# Altium footprint library hand_ad_lib.PcbLib: 105 footprints (part 7 of 7)
Each footprint in its own frame and in the unit in brackets; x right, y up, seen from the top. Pads: shape width x height; smd on the part's side, far side on the other; paste and mask are expansions set on the pad; w line width, h text height; cw(c..) or ccw(c..) is an arc to the next point about the centre after c.
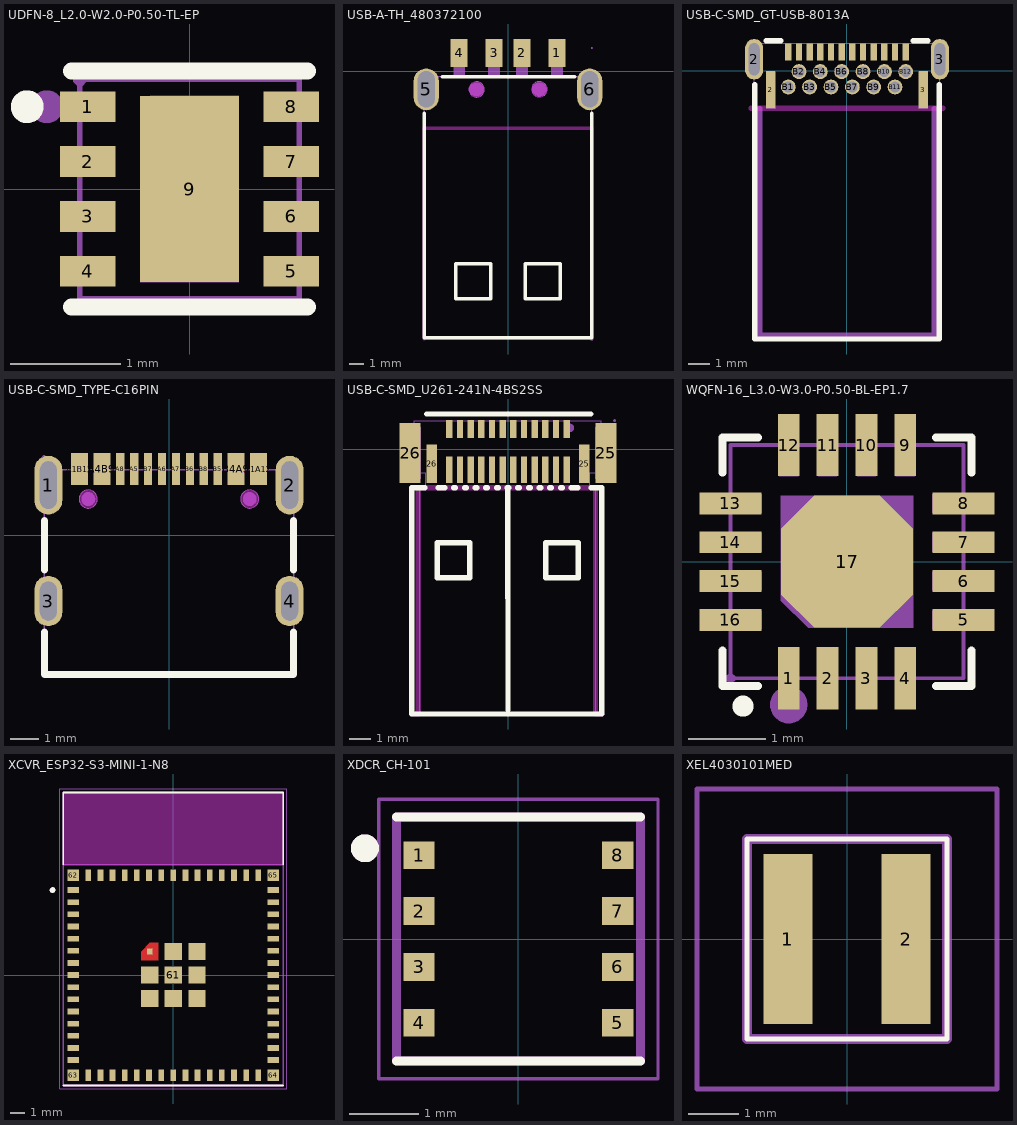
[diagram p6: the footprints below, top view; thin cyan lines are the x and y axes]

## UDFN-8_L2.0-W2.0-P0.50-TL-EP [mm]
pads (9):
  rect 0.505x0.28 smd: 1(-0.928,0.75) 2(-0.928,0.25) 3(-0.928,-0.25) 4(-0.928,-0.75) 5(0.928,-0.75) 6(0.928,-0.25) 7(0.928,0.25) 8(0.928,0.75)
  rect 0.9x1.7 smd: 9(0,0)
Top Overlay:
  circle w0.15: c-1.48,0.75 r0.075
  lines w0.152: -1.076,-1.076 1.076,-1.076 ; -1.076,1.076 1.076,1.076
Mechanical 6:
  circle w0.15: c-1.3,0.75 r0.075
Mechanical 15:
  region: -0.94,1 -0.941,1.024 -0.976,1.059 -1.024,1.059 -1.059,1.024 -1.06,1 -1.059,0.976 -1.024,0.941 -0.976,0.941 -0.941,0.976
  region: -1,0.875 -0.7,0.875 -0.7,0.625 -1,0.625
  region: -1,0.375 -0.7,0.375 -0.7,0.125 -1,0.125
  region: -1,-0.125 -0.7,-0.125 -0.7,-0.375 -1,-0.375
  region: -1,-0.625 -0.7,-0.625 -0.7,-0.875 -1,-0.875
  region: 1,-0.625 0.7,-0.625 0.7,-0.875 1,-0.875
  region: 1,-0.125 0.7,-0.125 0.7,-0.375 1,-0.375
  region: 1,0.375 0.7,0.375 0.7,0.125 1,0.125
  region: 1,0.875 0.7,0.875 0.7,0.625 1,0.625
  region: -0.36,0.85 0.45,0.85 0.45,-0.85 -0.45,-0.85 -0.45,0.76
  lines w0.051: -1,-1 1,-1 1,1 -1,1 -1,-1
3D body "TPS22965DSGR.x_t": height 0.81, standoff 0, extent -1,-0.99 1,0.99

## USB-A-TH_480372100 [mm]
pads (6):
  rect 1.2x2 smd paste-100 mask+0.051: 1(3.5,1.3) 2(1,1.3) 3(-1,1.3) 4(-3.5,1.3)
  oval 1.8x3 hole 1.2 slot 2.6 at 90 deg: 5(-5.85,-1.3) 6(5.85,-1.3)
Top Overlay:
  lines w0.254: -6,-3.021 -6,-19.09 ; -4.7,-0.39 4.762,-0.39 ; 6,-3.021 6,-19.09 -6,-19.09 ; -6,-19.09 -6,-19.09 ; -3.75,-16.29 -3.75,-13.79 -1.25,-13.79 -1.25,-16.29 -3.75,-16.29 ; 1.25,-16.29 1.25,-13.79 3.75,-13.79 3.75,-16.29 1.25,-16.29
Top Paste:
  region: 6.75,-1.9 6.75,-2.018 6.689,-2.247 6.57,-2.452 6.403,-2.62 6.197,-2.739 5.968,-2.8 5.731,-2.8 5.503,-2.739 5.297,-2.62 5.13,-2.452 5.011,-2.247 4.95,-2.018 4.95,-1.9 4.95,-0.7 4.95,-0.581 5.011,-0.352 5.13,-0.147 5.297,0.02 5.503,0.139 5.731,0.2 5.968,0.2 6.197,0.139 6.403,0.02 6.57,-0.147 6.689,-0.352 6.75,-0.581 6.75,-0.7
  region: -4.95,-1.9 -4.95,-2.018 -5.011,-2.247 -5.13,-2.452 -5.297,-2.62 -5.502,-2.739 -5.731,-2.8 -5.968,-2.8 -6.197,-2.739 -6.402,-2.62 -6.57,-2.452 -6.689,-2.247 -6.75,-2.018 -6.75,-1.9 -6.75,-0.7 -6.75,-0.581 -6.689,-0.352 -6.57,-0.147 -6.402,0.02 -6.197,0.139 -5.968,0.2 -5.731,0.2 -5.502,0.139 -5.297,0.02 -5.13,-0.147 -5.011,-0.352 -4.95,-0.581 -4.95,-0.7
  region: -4.101,2.299 -2.9,2.299 -2.9,0.3 -4.101,0.3
  region: 2.9,2.299 4.101,2.299 4.101,0.3 2.9,0.3
  region: 0.4,2.299 1.599,2.299 1.599,0.3 0.4,0.3
  region: -1.599,2.299 -0.4,2.299 -0.4,0.3 -1.599,0.3
Keep-Out Layer:
  board cut-out: 2.8,-1.3 2.799,-1.191 2.714,-0.991 2.559,-0.839 2.359,-0.756 2.141,-0.756 1.941,-0.839 1.786,-0.991 1.701,-1.191 1.7,-1.3 1.701,-1.408 1.786,-1.608 1.941,-1.761 2.141,-1.843 2.359,-1.843 2.559,-1.761 2.714,-1.608 2.799,-1.408
  board cut-out: -1.7,-1.313 -1.701,-1.204 -1.786,-1.004 -1.94,-0.851 -2.141,-0.769 -2.358,-0.769 -2.559,-0.851 -2.714,-1.004 -2.799,-1.204 -2.8,-1.312 -2.799,-1.421 -2.714,-1.621 -2.559,-1.774 -2.358,-1.856 -2.141,-1.856 -1.941,-1.774 -1.786,-1.621 -1.701,-1.421
Keep-Out Layer:
  lines w0.254: -6,-4.094 6,-4.094 ; -6,-4.094 -6,-19.16 -6,-4.094 ; -6,-4.094 6,-4.094 ; 6,-4.094 6,-19.17 6,-4.094
Mechanical 1:
  circle w0.005: c2.25,-1.3 r0.55
  circle w0.005: c-2.25,-1.313 r0.55
Mechanical 6:
  circle w0.5: c-2.25,-1.313 r0.25
  circle w0.5: c2.25,-1.3 r0.25
Mechanical 15:
  region: 3.101,-0.37 3.101,0.57 3.901,0.56 3.901,-0.37
  region: 3.101,0.56 3.101,1.64 3.901,1.64 3.901,0.55
  region: 0.6,-0.37 0.6,0.57 1.4,0.56 1.4,-0.37
  region: 0.6,0.56 0.6,1.64 1.4,1.64 1.4,0.55
  region: -1.4,-0.37 -1.4,0.57 -0.6,0.56 -0.6,-0.37
  region: -1.4,0.56 -1.4,1.64 -0.6,1.64 -0.6,0.55
  region: 6,-2.354 5.7,-2.354 5.7,-0.354 6,-0.354
  region: -5.7,-2.354 -6,-2.354 -6,-0.354 -5.7,-0.354
  region: -3.9,0.56 -3.9,1.64 -3.1,1.64 -3.1,0.55
  region: -3.9,-0.37 -3.9,0.57 -3.1,0.56 -3.1,-0.37
  region: 6.06,1.646 6.06,1.671 6.025,1.706 5.975,1.706 5.94,1.671 5.94,1.646 5.94,1.622 5.975,1.586 6.025,1.586 6.06,1.621
  lines w0.051: -6,-19.154 6,-19.154 6,-0.354 -6,-0.354 -6,-19.154
3D body "480372100.x_t": height 2, standoff -2.5, extent -6.339,-19.165 6.339,1.585

## USB-C-SMD_GT-USB-8013A [mm]
pads (28):
  oval 0.85x1.9 hole 0.5 slot 1.5 at 90 deg paste+0 mask+0.05: 2(-4.35,0.535) 3(4.35,0.535)
  rect 0.45x1.76 smd paste-100 mask+0.05: 2(-3.575,-0.885) 3(3.575,-0.885)
  rect 0.3x0.8 smd paste-100 mask+0.05: A1(2.75,0.885) A2(2.25,0.885) A3(1.75,0.885) A4(1.25,0.885) A5(0.75,0.885) A6(0.25,0.885) A7(-0.25,0.885) A8(-0.75,0.885) A9(-1.25,0.885) A10(-1.75,0.885) A11(-2.25,0.885) A12(-2.75,0.885)
  round 0.7 hole 0.5 paste-100 mask+0.05: B1(-2.75,-0.765) B2(-2.25,-0.045) B3(-1.75,-0.765) B4(-1.25,-0.045) B5(-0.75,-0.765) B6(-0.25,-0.045) B7(0.25,-0.765) B8(0.75,-0.045) B9(1.25,-0.765) B10(1.75,-0.045) B11(2.25,-0.765) B12(2.75,-0.045)
Top Overlay:
  lines w0.254: -4.318,-0.645 -4.318,-12.573 4.318,-12.573 4.318,-0.645 ; -3.787,1.397 -3.102,1.397 ; 3.102,1.397 3.787,1.397
Top Paste:
  drawing of 26 lines, arcs and shapes, not listed
Keep-Out Layer:
  lines w0.254: -4.5,-1.765 4.5,-1.765 -4.5,-1.765
Mechanical 6:
  region: -3.973,-1.8 -3.973,-12.273 3.973,-12.273 3.973,-1.8 3.973,-1.747 4.047,-1.673 4.153,-1.673 4.227,-1.747 4.227,-1.8 4.227,-12.4 4.227,-12.425 4.208,-12.472 4.172,-12.508 4.125,-12.527 4.1,-12.527 -4.1,-12.527 -4.125,-12.527 -4.172,-12.508 -4.208,-12.472 -4.227,-12.425 -4.227,-12.4 -4.227,-1.8 -4.227,-1.747 -4.153,-1.673 -4.047,-1.673 -3.973,-1.747
Mechanical 15:
  drawing of 33 lines, arcs and shapes, not listed
3D body "GT-USB-8013A.x_t": height 1.45, standoff -1.6, extent -4.377,-12.493 4.323,1.257

## USB-C-SMD_TYPE-C16PIN [mm]
pads (16):
  oval 1x2.1 hole 0.6 slot 1.7 at 90 deg: 1(-4.32,1.787) 2(4.32,1.787)
  oval 1x1.8 hole 0.6 slot 1.4 at 90 deg: 3(-4.32,-2.362) 4(4.32,-2.362)
  rect 0.6x1.15 smd paste-100 mask+0.051: A1B12(-3.2,2.362) A4B9(-2.4,2.362) B1A12(3.2,2.362) B4A9(2.4,2.362)
  rect 0.3x1.15 smd paste-100 mask+0.051: A5(-1.25,2.362) A6(-0.25,2.362) A7(0.25,2.362) A8(-1.75,2.362) B5(1.75,2.362) B6(0.75,2.362) B7(-0.75,2.362) B8(1.25,2.362)
Top Overlay:
  lines w0.254: -4.45,-3.482 -4.45,-5 4.45,-5 4.45,-3.482 ; -4.45,-1.243 -4.45,0.518 ; 4.45,-1.243 4.45,0.518
Top Paste:
  region: -3.5,2.937 -2.9,2.937 -2.9,1.787 -3.5,1.787
  region: -2.7,2.937 -2.1,2.937 -2.1,1.787 -2.7,1.787
  region: 2.9,2.937 3.5,2.937 3.5,1.787 2.9,1.787
  region: 2.1,2.937 2.7,2.937 2.7,1.787 2.1,1.787
  region: 1.6,2.937 1.9,2.937 1.9,1.787 1.6,1.787
  region: 1.1,2.937 1.4,2.937 1.4,1.787 1.1,1.787
  region: 0.6,2.937 0.9,2.937 0.9,1.787 0.6,1.787
  region: 0.1,2.937 0.4,2.937 0.4,1.787 0.1,1.787
  region: -0.4,2.937 -0.1,2.937 -0.1,1.787 -0.4,1.787
  region: -0.9,2.937 -0.6,2.937 -0.6,1.787 -0.9,1.787
  region: -1.4,2.937 -1.1,2.937 -1.1,1.787 -1.4,1.787
  region: -1.9,2.937 -1.6,2.937 -1.6,1.787 -1.9,1.787
  region: 3.82,-1.962 3.82,-1.863 3.896,-1.679 4.037,-1.539 4.221,-1.462 4.419,-1.462 4.603,-1.539 4.744,-1.679 4.82,-1.863 4.82,-1.962 4.82,-2.762 4.82,-2.862 4.744,-3.046 4.603,-3.186 4.419,-3.262 4.221,-3.262 4.037,-3.186 3.896,-3.046 3.82,-2.862 3.82,-2.762
  region: -4.82,-1.962 -4.82,-1.863 -4.744,-1.679 -4.603,-1.539 -4.419,-1.462 -4.221,-1.462 -4.037,-1.539 -3.896,-1.679 -3.82,-1.863 -3.82,-1.962 -3.82,-2.762 -3.82,-2.862 -3.896,-3.046 -4.037,-3.186 -4.221,-3.262 -4.419,-3.262 -4.603,-3.186 -4.744,-3.046 -4.82,-2.862 -4.82,-2.762
  region: 3.82,2.337 3.82,2.437 3.896,2.621 4.037,2.761 4.221,2.837 4.419,2.837 4.603,2.761 4.744,2.621 4.82,2.437 4.82,2.337 4.82,1.237 4.82,1.138 4.744,0.954 4.603,0.814 4.419,0.737 4.221,0.737 4.037,0.814 3.896,0.954 3.82,1.138 3.82,1.237
  region: -4.82,2.337 -4.82,2.437 -4.744,2.621 -4.603,2.761 -4.419,2.837 -4.221,2.837 -4.037,2.761 -3.896,2.621 -3.82,2.437 -3.82,2.337 -3.82,1.237 -3.82,1.138 -3.896,0.954 -4.037,0.814 -4.221,0.737 -4.419,0.737 -4.603,0.814 -4.744,0.954 -4.82,1.138 -4.82,1.237
Keep-Out Layer:
  board cut-out: 3.215,1.288 3.215,1.353 3.166,1.472 3.074,1.564 2.955,1.613 2.825,1.613 2.706,1.564 2.614,1.472 2.565,1.353 2.565,1.288 2.565,1.223 2.615,1.104 2.706,1.012 2.825,0.963 2.955,0.963 3.074,1.013 3.166,1.104 3.215,1.223
  board cut-out: -2.565,1.288 -2.565,1.353 -2.615,1.472 -2.706,1.564 -2.825,1.613 -2.955,1.613 -3.074,1.564 -3.166,1.472 -3.215,1.353 -3.215,1.288 -3.215,1.223 -3.166,1.104 -3.074,1.012 -2.955,0.963 -2.825,0.963 -2.706,1.013 -2.614,1.104 -2.565,1.223
Mechanical 1:
  circle w0.005: c2.89,1.288 r0.325
  circle w0.005: c-2.89,1.288 r0.325
Mechanical 6:
  circle w0.25: c-2.89,1.288 r0.125
  circle w0.25: c2.89,1.288 r0.125
Mechanical 15:
  region: -4.41,2.803 -4.411,2.827 -4.446,2.86 -4.494,2.86 -4.529,2.827 -4.53,2.803 -4.529,2.778 -4.494,2.745 -4.446,2.745 -4.411,2.778
  region: -3.4,2.802 -3,2.802 -3,2.102 -3.4,2.102
  region: -2.6,2.802 -2.2,2.802 -2.2,2.102 -2.6,2.102
  region: 2.2,2.802 2.6,2.802 2.6,2.102 2.2,2.102
  region: 3,2.802 3.4,2.802 3.4,2.102 3,2.102
  region: -1.35,2.802 -1.15,2.802 -1.15,2.102 -1.35,2.102
  region: -0.85,2.802 -0.65,2.802 -0.65,2.102 -0.85,2.102
  region: -0.35,2.802 -0.15,2.802 -0.15,2.102 -0.35,2.102
  region: 0.15,2.802 0.35,2.802 0.35,2.102 0.15,2.102
  region: 0.65,2.802 0.85,2.802 0.85,2.102 0.65,2.102
  region: 1.15,2.802 1.35,2.802 1.35,2.102 1.15,2.102
  region: 1.65,2.802 1.85,2.802 1.85,2.102 1.65,2.102
  region: -4.47,2.337 -4.17,2.337 -4.17,1.237 -4.47,1.237
  region: 4.17,2.337 4.47,2.337 4.47,1.237 4.17,1.237
  region: 4.17,-1.962 4.47,-1.962 4.47,-2.762 4.17,-2.762
  region: -4.47,-1.962 -4.17,-1.962 -4.17,-2.762 -4.47,-2.762
  region: -1.85,2.803 -1.65,2.803 -1.65,2.103 -1.85,2.103
  lines w0.051: -4.47,-5.012 -4.47,2.338 4.47,2.338 4.47,-5.012 -4.47,-5.012
Multi-Layer keep-out:
  region: 3.215,1.288 3.215,1.353 3.166,1.472 3.074,1.564 2.955,1.613 2.825,1.613 2.706,1.564 2.614,1.472 2.565,1.353 2.565,1.288 2.565,1.223 2.615,1.104 2.706,1.012 2.825,0.963 2.955,0.963 3.074,1.013 3.166,1.104 3.215,1.223
  region: -2.565,1.288 -2.565,1.353 -2.615,1.472 -2.706,1.564 -2.825,1.613 -2.955,1.613 -3.074,1.564 -3.166,1.472 -3.215,1.353 -3.215,1.288 -3.215,1.223 -3.166,1.104 -3.074,1.012 -2.955,0.963 -2.825,0.963 -2.706,1.013 -2.614,1.104 -2.565,1.223
3D body "TYPE-C16PIN.x_t": height 3.26, standoff -0.84, extent -4.473,-5.079 4.467,2.821

## USB-C-SMD_U261-241N-4BS2SS [mm]
pads (28):
  rect 0.5x1.8 smd paste+0 mask+0.05: 25(3.575,-0.68) 26(-3.575,-0.68)
  rect 1x2.8 smd paste+0 mask+0.05: 25(4.59,-0.18) 26(-4.59,-0.18)
  rect 0.3x0.85 smd paste+0 mask+0.05: A1(2.75,0.955) A2(2.25,0.955) A3(1.75,0.955) A4(1.25,0.955) A5(0.75,0.955) A6(0.25,0.955) A7(-0.25,0.955) A8(-0.75,0.955) A9(-1.25,0.955) A10(-1.75,0.955) A11(-2.25,0.955) A12(-2.75,0.955)
  rect 0.3x1.25 smd paste+0 mask+0.05: B1(-2.75,-0.955) B2(-2.25,-0.955) B3(-1.75,-0.955) B4(-1.25,-0.955) B5(-0.75,-0.955) B6(-0.25,-0.955) B7(0.25,-0.955) B8(0.75,-0.955) B9(1.25,-0.955) B10(1.75,-0.955) B11(2.25,-0.955) B12(2.75,-0.955)
Top Overlay:
  lines w0.254: -3.889,-1.8 -4.2,-1.8 -4.5,-1.8 -4.5,-12.4 -4.4,-12.4 -4.1,-12.4 4.1,-12.4 4.4,-12.4 4.4,-1.8 4.3,-1.8 4.2,-1.8 3.889,-1.8 ; -3.81,1.651 3.888,1.651 ; -3.26,-1.8 -2.964,-1.8 ; -2.535,-1.8 -2.464,-1.8 ; -2.035,-1.8 -1.964,-1.8 ; -1.535,-1.8 -1.464,-1.8 ; -1.035,-1.8 -0.964,-1.8 ; -0.535,-1.8 -0.464,-1.8 ; -0.035,-1.8 0.036,-1.8 ; -0.009,-1.834 0,-12.192 ; 0.465,-1.8 0.536,-1.8 ; 0.965,-1.8 1.036,-1.8 ; 1.465,-1.8 1.536,-1.8 ; 1.965,-1.8 2.036,-1.8 ; 2.465,-1.8 2.536,-1.8 ; 2.965,-1.8 3.261,-1.8 ; -3.307,-6.025 -1.783,-6.025 -1.783,-4.374 -3.307,-4.374 -3.307,-6.025 ; 1.773,-6.025 3.297,-6.025 3.297,-4.374 1.773,-4.374 1.773,-6.025
Keep-Out Layer:
  lines w0.254: -4.2,-12.4 -4.2,-1.8 ; -4.2,-12.4 -4.5,-12.4 -4.2,-12.4 ; -4.2,-12.4 -4.2,-1.8 ; -4.2,-1.8 4.1,-1.8 ; -4.2,-1.8 4.1,-1.8 ; 4.1,-12.4 4.4,-12.4 4.1,-12.4 ; 4.1,-12.4 4.1,-1.8 ; 4.1,-12.4 4.1,-1.8
Mechanical 6:
  circle w0.2: c2.9,1 r0.1
Mechanical 15:
  drawing of 41 lines, arcs and shapes, not listed
3D body "U261-241N-4BS2SS.x_t": height 1.45, standoff -0.95, extent -4.99,-12.172 4.99,1.278

## WQFN-16_L3.0-W3.0-P0.50-BL-EP1.7 [mm]
pads (17):
  rect 0.28x0.8 smd paste-100 mask+0.051: 1(-0.75,-1.5) 2(-0.25,-1.5) 3(0.25,-1.5) 4(0.75,-1.5) 9(0.75,1.5) 10(0.25,1.5) 11(-0.25,1.5) 12(-0.75,1.5)
  rect 0.8x0.28 smd paste-100 mask+0.051: 5(1.5,-0.75) 6(1.5,-0.25) 7(1.5,0.25) 8(1.5,0.75) 13(-1.5,0.75) 14(-1.5,0.25) 15(-1.5,-0.25) 16(-1.5,-0.75)
  oct 1.7x1.7 smd paste-100 mask+0.051: 17(0,0)
Top Overlay:
  lines w0.102: -1.6,-1.144 -1.6,-1.6 -1.144,-1.6 ; -1.6,1.144 -1.6,1.6 -1.144,1.6 ; 1.144,-1.6 1.6,-1.6 1.6,-1.144 ; 1.144,1.6 1.6,1.6 1.6,1.144
  lines w0.25: -1.34,-1.85 ccw(c-1.339,-1.86) -1.337,-1.85
Top Paste:
  region: -0.89,-1.1 -0.61,-1.1 -0.61,-1.9 -0.89,-1.9
  region: -0.39,-1.1 -0.11,-1.1 -0.11,-1.9 -0.39,-1.9
  region: 0.11,-1.1 0.39,-1.1 0.39,-1.9 0.11,-1.9
  region: 0.61,-1.1 0.89,-1.1 0.89,-1.9 0.61,-1.9
  region: 1.1,-0.61 1.9,-0.61 1.9,-0.89 1.1,-0.89
  region: 1.1,-0.11 1.9,-0.11 1.9,-0.39 1.1,-0.39
  region: 1.1,0.39 1.9,0.39 1.9,0.11 1.1,0.11
  region: 1.1,0.89 1.9,0.89 1.9,0.61 1.1,0.61
  region: 0.61,1.9 0.89,1.9 0.89,1.1 0.61,1.1
  region: 0.11,1.9 0.39,1.9 0.39,1.1 0.11,1.1
  region: -0.39,1.9 -0.11,1.9 -0.11,1.1 -0.39,1.1
  region: -0.89,1.9 -0.61,1.9 -0.61,1.1 -0.89,1.1
  region: -1.9,0.89 -1.1,0.89 -1.1,0.61 -1.9,0.61
  region: -1.9,0.39 -1.1,0.39 -1.1,0.11 -1.9,0.11
  region: -1.9,-0.11 -1.1,-0.11 -1.1,-0.39 -1.9,-0.39
  region: -1.9,-0.61 -1.1,-0.61 -1.1,-0.89 -1.9,-0.89
  region: -0.68,0.68 0.68,0.68 0.68,-0.68 -0.4,-0.68 -0.68,-0.4
Mechanical 6:
  circle w0.24: c-0.75,-1.84 r0.12
Mechanical 15:
  region: -1.5,-0.87 -1.5,-0.63 -1.1,-0.63 -1.1,-0.87
  region: -1.5,-0.37 -1.5,-0.13 -1.1,-0.13 -1.1,-0.37
  region: -1.5,0.13 -1.5,0.37 -1.1,0.37 -1.1,0.13
  region: -1.5,0.63 -1.5,0.87 -1.1,0.87 -1.1,0.63
  region: -0.87,1.1 -0.87,1.5 -0.63,1.5 -0.63,1.1
  region: -0.37,1.1 -0.37,1.5 -0.13,1.5 -0.13,1.1
  region: 0.13,1.1 0.13,1.5 0.37,1.5 0.37,1.1
  region: 0.63,1.1 0.63,1.5 0.87,1.5 0.87,1.1
  region: 1.1,0.63 1.1,0.87 1.5,0.87 1.5,0.63
  region: 1.1,0.13 1.1,0.37 1.5,0.37 1.5,0.13
  region: 1.1,-0.37 1.1,-0.13 1.5,-0.13 1.5,-0.37
  region: 1.1,-0.87 1.1,-0.63 1.5,-0.63 1.5,-0.87
  region: 0.63,-1.5 0.63,-1.1 0.87,-1.1 0.87,-1.5
  region: 0.13,-1.5 0.13,-1.1 0.37,-1.1 0.37,-1.5
  region: -0.37,-1.5 -0.37,-1.1 -0.13,-1.1 -0.13,-1.5
  region: -0.87,-1.5 -0.87,-1.1 -0.63,-1.1 -0.63,-1.5
  region: -0.85,0.85 0.85,0.85 0.85,-0.85 -0.5,-0.85 -0.85,-0.5
  region: -1.44,-1.5 -1.441,-1.476 -1.476,-1.442 -1.524,-1.442 -1.559,-1.476 -1.56,-1.5 -1.559,-1.524 -1.524,-1.558 -1.476,-1.558 -1.441,-1.524
  lines w0.051: -1.5,-1.5 -1.5,1.5 1.5,1.5 1.5,-1.5 -1.5,-1.5
3D body "BQ25302RTER.x_t": height 0.78, standoff 0, extent -1.501,-1.501 1.501,1.501

## XCVR_ESP32-S3-MINI-1-N8 [mm]
height 2.55
pads (73):
  rect 0.8x0.4 smd: 1(-7,5.95) 2(-7,5.1) 3(-7,4.25) 4(-7,3.4) 5(-7,2.55) 6(-7,1.7) 7(-7,0.85) 8(-7,0) 9(-7,-0.85) 10(-7,-1.7) 11(-7,-2.55) 12(-7,-3.4) 13(-7,-4.25) 14(-7,-5.1) 15(-7,-5.95) 31(7,-5.95) 32(7,-5.1) 33(7,-4.25) 34(7,-3.4) 35(7,-2.55) 36(7,-1.7) 37(7,-0.85) 38(7,0) 39(7,0.85) 40(7,1.7) 41(7,2.55) 42(7,3.4) 43(7,4.25) 44(7,5.1) 45(7,5.95)
  rect 0.4x0.8 smd: 16(-5.95,-7) 17(-5.1,-7) 18(-4.25,-7) 19(-3.4,-7) 20(-2.55,-7) 21(-1.7,-7) 22(-0.85,-7) 23(0,-7) 24(0.85,-7) 25(1.7,-7) 26(2.55,-7) 27(3.4,-7) 28(4.25,-7) 29(5.1,-7) 30(5.95,-7) 46(5.95,7) 47(5.1,7) 48(4.25,7) 49(3.4,7) 50(2.55,7) 51(1.7,7) 52(0.85,7) 53(0,7) 54(-0.85,7) 55(-1.7,7) 56(-2.55,7) 57(-3.4,7) 58(-4.25,7) 59(-5.1,7) 60(-5.95,7)
  rect 1.2x1.2 smd: 61(0,0) 61_2(0,1.65) 61_3(1.65,1.65) 61_4(1.65,0) 61_5(1.65,-1.65) 61_6(0,-1.65) 61_7(-1.65,-1.65) 61_8(-1.65,0)
  rect 0.4x0.4 smd paste-1 mask+0: 61_1(-1.65,1.65)
  rect 0.8x0.8 smd: 62(-7,7) 63(-7,-7) 64(7,-7) 65(7,7)
Top Layer:
  region: -1.05,1.05 -2.25,1.05 -2.25,1.65 -1.65,2.25 -1.05,2.25
Top Overlay:
  circle w0.2: c-8.45,5.95 r0.1
  lines w0.127: -7.7,-7.725 7.7,-7.725 ; -7.7,7.725 -7.7,12.775 7.7,12.775 7.7,7.725
Top Paste:
  region: -1.05,1.05 -2.25,1.05 -2.25,1.65 -1.65,2.25 -1.05,2.25
Top Solder:
  region: -0.95,0.95 -2.35,0.95 -2.35,1.7 -1.7,2.35 -0.95,2.35
Keep-Out Layer:
  region: 7.7,7.725 -7.7,7.725 -7.7,12.775 7.7,12.775
  region: 7.7,7.725 -7.7,7.725 -7.7,12.775 7.7,12.775
Mechanical 13:
  circle w0.2: c-8.45,5.95 r0.1
  lines w0.127: -7.7,7.725 -7.7,-7.725 7.7,-7.725 7.7,7.725 ; -7.7,7.725 -7.7,12.775 7.7,12.775 7.7,7.725 ; -7.7,7.725 7.7,7.725
Mechanical 15:
  lines w0.05: -7.95,-7.975 -7.95,13.025 7.95,13.025 7.95,-7.975 -7.95,-7.975
3D body "step_temp.STEP": height 2.55, standoff 0, extent -7.7,-7.725 7.7,12.775

## XDCR_CH-101 [mm]
pads (8):
  rect 0.45x0.4 smd mask+0: 1(-1.425,1.2) 2(-1.425,0.4) 3(-1.425,-0.4) 4(-1.425,-1.2) 5(1.425,-1.2) 6(1.425,-0.4) 7(1.425,0.4) 8(1.425,1.2)
Top Overlay:
  circle w0.2: c-2.2,1.3 r0.1
  lines w0.127: -1.75,-1.75 1.75,-1.75 ; -1.75,1.75 1.75,1.75
Top Solder:
  region: -1.15,0.15 -1.7,0.15 -1.7,0.65 -1.15,0.65
  region: -1.15,-0.65 -1.7,-0.65 -1.7,-0.15 -1.15,-0.15
  region: -1.15,0.95 -1.7,0.95 -1.7,1.45 -1.15,1.45
  region: -1.15,-1.45 -1.7,-1.45 -1.7,-0.95 -1.15,-0.95
  region: 1.7,0.15 1.15,0.15 1.15,0.65 1.7,0.65
  region: 1.7,-0.65 1.15,-0.65 1.15,-0.15 1.7,-0.15
  region: 1.7,0.95 1.15,0.95 1.15,1.45 1.7,1.45
  region: 1.7,-1.45 1.15,-1.45 1.15,-0.95 1.7,-0.95
Mechanical 13:
  circle w0.2: c-2.2,1.3 r0.1
  lines w0.127: -1.75,-1.75 1.75,-1.75 1.75,1.75 -1.75,1.75 -1.75,-1.75
Mechanical 15:
  lines w0.05: -2,-2 2,-2 2,2 -2,2 -2,-2
3D body "CH-101.x_t": height 1.26, standoff 0, extent -1.75,-1.75 1.75,1.75

## XEL4030101MED [mm]
pads (2):
  rect 0.98x3.4 smd: 1(-1.185,0) 2(1.185,0)
Top Overlay:
  lines w0.1: -2,-2 2,-2 2,2 -2,2 -2,-2
Mechanical 13:
  lines w0.2: -2,-2 2,-2 2,2 -2,2 -2,-2
Mechanical 15:
  lines w0.1: -3,-3 3,-3 3,3 -3,3 -3,-3
3D body "XEL4030-102MEC.stp": height 3.3, standoff 0, extent -2,-2 2,2